# Altium schematic symbol library SCHLIB.SchLib: 2608 symbols (part 9 of 20) (continued)
## L-2.2uH-7A (continued)
FIXED IND 2.2UH 8.7A 15MOHM SMD; Manufacturer Part Number: XGL4030-222MEC; Manufacturer: COILCRAFT; Tolerance: ±20%; Isat: 7A; Shielding: Shielded; Frequency - Self Resonant: 40MHz; Inductance Frequency - Test: 1MHz; Object Type: Part; Design Item ID: L-2.2uH-7A; Series: XGL4030; Material - Core: -; DCR: 15mOhm; Q @ Freq: -; Ratings: AEC-Q200; Operating Temperature: -40°C~125°C; Features: -; Mounting Type: SurfaceMount; Size: 4.00mmx4.00mm; Height: 3.10mm; Category: Inductor
footprint XGL4030
pins: 1, 2

## L-3.3uH-1.05A
designator L?  Inductance: 3.3uH  Current Rating (Amps): 1.1A
FIXED IND 3.3UH 1.1A 228MOHM SMD; Manufacturer Part Number: XPL2010-332MLC; Manufacturer: COILCRAFT; Tolerance: ±20%; Isat: 1.05A; Shielding: Shielded; Frequency - Self Resonant: 55MHz; Inductance Frequency - Test: 1MHz; Object Type: Part; Design Item ID: L-3.3uH-1.05A; Series: XPL2010; Material - Core: -; DCR: 228mOhm; Q @ Freq: -; Ratings: AEC-Q200; Operating Temperature: -40°C~125°C; Features: -; Mounting Type: SurfaceMount; Size: 2.00mmx1.90mm; Height: 1.00mm; Category: Inductor
footprint XPL2010
pins: 1, 2

## L-3.3uH-1.5A
designator L?  Inductance: 3.3uH  Current Rating (Amps): 1.4A
FIXED IND 3.3UH 1.4A 130MOHM SMD; Manufacturer Part Number: LPS3015-332MRC; Manufacturer: COILCRAFT; Material - Core: Ferrite; Tolerance: ±20%; Isat: 1.5A; Shielding: Shielded; Frequency - Self Resonant: 90MHz; Inductance Frequency - Test: 100kHz; Object Type: Part; Design Item ID: L-3.3uH-1.5A; Series: LPS3015; DCR: 130mOhm; Q @ Freq: -; Ratings: AEC-Q200; Operating Temperature: -40°C~125°C; Features: -; Mounting Type: SurfaceMount; Size: 2.95mmx2.95mm; Height: 1.50mm; Category: Inductor
footprint LPS3015
pins: 1, 2

## L-3.3uH-2A
designator L?  Inductance: 3.3uH  Current Rating (Amps): 1.9A
FIXED IND 3.3UH 1.9A 80MOHM SMD; Manufacturer Part Number: LPS4018-332MRC; Manufacturer: COILCRAFT; Material - Core: Ferrite; Tolerance: ±20%; Isat: 2A; Shielding: Shielded; Frequency - Self Resonant: 75MHz; Inductance Frequency - Test: 100kHz; Object Type: Part; Design Item ID: L-3.3uH-2A; Series: LPS4018; DCR: 80mOhm; Q @ Freq: -; Ratings: AEC-Q200; Operating Temperature: -40°C~125°C; Features: -; Mounting Type: SurfaceMount; Size: 3.90mmx3.90mm; Height: 1.80mm; Category: Inductor
footprint LPS4018
pins: 1, 2

## L-3.3uH-4.8A
designator L?  Inductance: 3.3uH  Current Rating (Amps): 6.6A
FIXED IND 3.3UH 6.6A 34MOHM SMD; Manufacturer Part Number: XGL4020-332MEC; Manufacturer: COILCRAFT; Tolerance: ±20%; Isat: 4.8A; Shielding: Shielded; Frequency - Self Resonant: 30MHz; Inductance Frequency - Test: 1MHz; Object Type: Part; Design Item ID: L-3.3uH-4.8A; Series: XGL4020; Material - Core: -; DCR: 34mOhm; Q @ Freq: -; Ratings: AEC-Q200; Operating Temperature: -40°C~125°C; Features: -; Mounting Type: SurfaceMount; Size: 4.00mmx4.00mm; Height: 2.10mm; Category: Inductor
footprint XGL4020
pins: 1, 2

## L-3.3uH-5.3A
designator L?  Inductance: 3.3uH  Current Rating (Amps): 7.5A
FIXED IND 3.3UH 7.5A 21.9MOHM SM; Manufacturer Part Number: XGL4030-332MEC; Manufacturer: COILCRAFT; Tolerance: ±20%; Isat: 5.3A; Shielding: Shielded; Frequency - Self Resonant: 30MHz; Inductance Frequency - Test: 1MHz; Object Type: Part; Design Item ID: L-3.3uH-5.3A; Series: XGL4030; Material - Core: -; DCR: 21.9mOhm; Q @ Freq: -; Ratings: AEC-Q200; Operating Temperature: -40°C~125°C; Features: -; Mounting Type: SurfaceMount; Size: 4.00mmx4.00mm; Height: 3.10mm; Category: Inductor
footprint XGL4030
pins: 1, 2

## L-4.7uH-1.2A
designator L?  Inductance: 4.7uH  Current Rating (Amps): 1.2A
FIXED IND 4.7UH 1.2A 200MOHM SMD; Manufacturer Part Number: LPS3015-472MRC; Manufacturer: COILCRAFT; Material - Core: Ferrite; Tolerance: ±20%; Shielding: Shielded; Frequency - Self Resonant: 79MHz; Inductance Frequency - Test: 100kHz; Object Type: Part; Design Item ID: L-4.7uH-1.2A; Series: LPS3015; Isat: 1.2A; DCR: 200mOhm; Q @ Freq: -; Ratings: AEC-Q200; Operating Temperature: -40°C~125°C; Features: -; Mounting Type: SurfaceMount; Size: 2.95mmx2.95mm; Height: 1.50mm; Category: Inductor
footprint LPS3015
pins: 1, 2

## L-4.7uH-1.9A
designator L?  Inductance: 4.7uH  Current Rating (Amps): 1.8A
FIXED IND 4.7UH 1.8A 125MOHM SMD; Manufacturer Part Number: LPS4018-472MRC; Manufacturer: COILCRAFT; Material - Core: Ferrite; Tolerance: ±20%; Isat: 1.9A; Shielding: Shielded; Frequency - Self Resonant: 65MHz; Inductance Frequency - Test: 100kHz; Object Type: Part; Design Item ID: L-4.7uH-1.9A; Series: LPS4018; DCR: 125mOhm; Q @ Freq: -; Ratings: AEC-Q200; Operating Temperature: -40°C~125°C; Features: -; Mounting Type: SurfaceMount; Size: 3.90mmx3.90mm; Height: 1.80mm; Category: Inductor
footprint LPS4018
pins: 1, 2

## L-4.7uH-4.1A
designator L?  Inductance: 4.7uH  Current Rating (Amps): 5.6A
FIXED IND 4.7UH 5.6A 47.3MOHM SM; Manufacturer Part Number: XGL4020-472MEC; Manufacturer: COILCRAFT; Tolerance: ±20%; Isat: 4.1A; Shielding: Shielded; Frequency - Self Resonant: 23MHz; Inductance Frequency - Test: 1MHz; Object Type: Part; Design Item ID: L-4.7uH-4.1A; Series: XGL4020; Material - Core: -; DCR: 47.3mOhm; Q @ Freq: -; Ratings: AEC-Q200; Operating Temperature: -40°C~125°C; Features: -; Mounting Type: SurfaceMount; Size: 4.00mmx4.00mm; Height: 2.10mm; Category: Inductor
footprint XGL4020
pins: 1, 2

## L-4.7uH-4.4A
designator L?  Inductance: 4.7uH  Current Rating (Amps): 6.6A
FIXED IND 4.7UH 6.6A 31.5MOHM SM; Manufacturer Part Number: XGL4030-472MEC; Manufacturer: COILCRAFT; Tolerance: ±20%; Isat: 4.4A; Shielding: Shielded; Frequency - Self Resonant: 26MHz; Inductance Frequency - Test: 1MHz; Object Type: Part; Design Item ID: L-4.7uH-4.4A; Series: XGL4030; Material - Core: -; DCR: 31.5mOhm; Q @ Freq: -; Ratings: AEC-Q200; Operating Temperature: -40°C~125°C; Features: -; Mounting Type: SurfaceMount; Size: 4.00mmx4.00mm; Height: 3.10mm; Category: Inductor
footprint XGL4030
pins: 1, 2

## L-4.7uH-845mA
designator L?  Inductance: 4.7uH  Current Rating (Amps): 1A
FIXED IND 4.7UH 1A 370 MOHM SMD; Manufacturer Part Number: XPL2010-472MLC; Manufacturer: COILCRAFT; Tolerance: ±20%; Isat: 845mA; Shielding: Shielded; Frequency - Self Resonant: 40MHz; Inductance Frequency - Test: 1MHz; Object Type: Part; Design Item ID: L-4.7uH-845mA; Series: XPL2010; Material - Core: -; DCR: 370mOhm; Q @ Freq: -; Ratings: AEC-Q200; Operating Temperature: -40°C~125°C; Features: -; Mounting Type: SurfaceMount; Size: 2.00mmx1.90mm; Height: 1.00mm; Category: Inductor
footprint XPL2010
pins: 1, 2

## L-5.6uH-3.7A
designator L?  Inductance: 5.6uH  Current Rating (Amps): 5.3A
FIXED IND 5.6UH 5.3A 53.6MOHM SM; Manufacturer Part Number: XGL4020-562MEC; Manufacturer: COILCRAFT; Tolerance: ±20%; Isat: 3.7A; Shielding: Shielded; Frequency - Self Resonant: 22MHz; Inductance Frequency - Test: 1MHz; Object Type: Part; Design Item ID: L-5.6uH-3.7A; Series: XGL4020; Material - Core: -; DCR: 53.6mOhm; Q @ Freq: -; Ratings: AEC-Q200; Operating Temperature: -40°C~125°C; Features: -; Mounting Type: SurfaceMount; Size: 4.00mmx4.00mm; Height: 2.10mm; Category: Inductor
footprint XGL4020
pins: 1, 2

## L-5.6uH-4.2A
designator L?  Inductance: 5.6uH  Current Rating (Amps): 5.5A
FIXED IND 5.6UH 5.5A 34.7MOHM SM; Manufacturer Part Number: XGL4030-562MEC; Manufacturer: COILCRAFT; Tolerance: ±20%; Isat: 4.2A; Shielding: Shielded; Frequency - Self Resonant: 25MHz; Inductance Frequency - Test: 1MHz; Object Type: Part; Design Item ID: L-5.6uH-4.2A; Series: XGL4030; Material - Core: -; DCR: 34.7mOhm; Q @ Freq: -; Ratings: AEC-Q200; Operating Temperature: -40°C~125°C; Features: -; Mounting Type: SurfaceMount; Size: 4.00mmx4.00mm; Height: 3.10mm; Category: Inductor
footprint XGL4030
pins: 1, 2

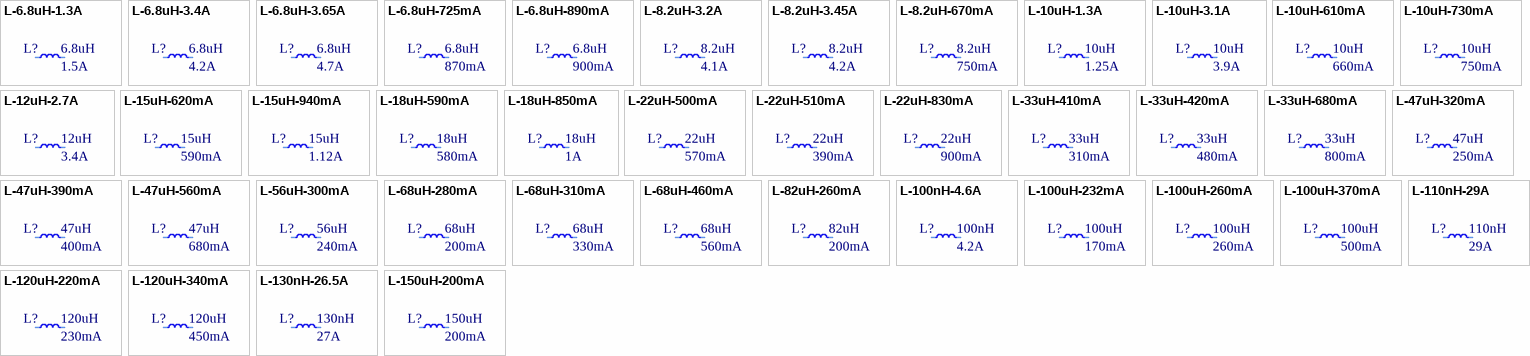
[diagram p39: symbols L-6.8uH-1.3A to L-150uH-200mA]

## L-6.8uH-1.3A
designator L?  Inductance: 6.8uH  Current Rating (Amps): 1.5A
FIXED IND 6.8UH 1.5A 150MOHM SMD; Manufacturer Part Number: LPS4018-682MRC; Manufacturer: COILCRAFT; Material - Core: Ferrite; Tolerance: ±20%; Isat: 1.3A; Shielding: Shielded; Frequency - Self Resonant: 50MHz; Inductance Frequency - Test: 100kHz; Object Type: Part; Design Item ID: L-6.8uH-1.3A; Series: LPS4018; DCR: 150mOhm; Q @ Freq: -; Ratings: AEC-Q200; Operating Temperature: -40°C~125°C; Features: -; Mounting Type: SurfaceMount; Size: 3.90mmx3.90mm; Height: 1.80mm; Category: Inductor
footprint LPS4018
pins: 1, 2

## L-6.8uH-3.4A
designator L?  Inductance: 6.8uH  Current Rating (Amps): 4.2A
FIXED IND 6.8UH 4.2A 70MOHM SMD; Manufacturer Part Number: XGL4020-682MEC; Manufacturer: COILCRAFT; Tolerance: ±20%; Isat: 3.4A; Shielding: Shielded; Frequency - Self Resonant: 21MHz; Inductance Frequency - Test: 1MHz; Object Type: Part; Design Item ID: L-6.8uH-3.4A; Series: XGL4020; Material - Core: -; DCR: 70mOhm; Q @ Freq: -; Ratings: AEC-Q200; Operating Temperature: -40°C~125°C; Features: -; Mounting Type: SurfaceMount; Size: 4.00mmx4.00mm; Height: 2.10mm; Category: Inductor
footprint XGL4020
pins: 1, 2

## L-6.8uH-3.65A
designator L?  Inductance: 6.8uH  Current Rating (Amps): 4.7A
FIXED IND 6.8UH 4.7A 47.9MOHM SM; Manufacturer Part Number: XGL4030-682MEC; Manufacturer: COILCRAFT; Tolerance: ±20%; Isat: 3.65A; Shielding: Shielded; Frequency - Self Resonant: 22MHz; Inductance Frequency - Test: 1MHz; Object Type: Part; Design Item ID: L-6.8uH-3.65A; Series: XGL4030; Material - Core: -; DCR: 47.9mOhm; Q @ Freq: -; Ratings: AEC-Q200; Operating Temperature: -40°C~125°C; Features: -; Mounting Type: SurfaceMount; Size: 4.00mmx4.00mm; Height: 3.10mm; Category: Inductor
footprint XGL4030
pins: 1, 2

## L-6.8uH-725mA
designator L?  Inductance: 6.8uH  Current Rating (Amps): 870mA
FIXED IND 6.8UH 870MA 463MOHM SM; Manufacturer Part Number: XPL2010-682MLC; Manufacturer: COILCRAFT; Tolerance: ±20%; Isat: 725mA; Shielding: Shielded; Frequency - Self Resonant: 33MHz; Inductance Frequency - Test: 1MHz; Object Type: Part; Design Item ID: L-6.8uH-725mA; Series: XPL2010; Material - Core: -; DCR: 463mOhm; Q @ Freq: -; Ratings: AEC-Q200; Operating Temperature: -40°C~125°C; Features: -; Mounting Type: SurfaceMount; Size: 2.00mmx1.90mm; Height: 1.00mm; Category: Inductor
footprint XPL2010
pins: 1, 2

## L-6.8uH-890mA
designator L?  Inductance: 6.8uH  Current Rating (Amps): 900mA
FIXED IND 6.8UH 900MA 300MOHM SM; Manufacturer Part Number: LPS3015-682MRC; Manufacturer: COILCRAFT; Material - Core: Ferrite; Tolerance: ±20%; Isat: 890mA; Shielding: Shielded; Frequency - Self Resonant: 58MHz; Inductance Frequency - Test: 100kHz; Object Type: Part; Design Item ID: L-6.8uH-890mA; Series: LPS3015; DCR: 300mOhm; Q @ Freq: -; Ratings: AEC-Q200; Operating Temperature: -40°C~125°C; Features: -; Mounting Type: SurfaceMount; Size: 2.95mmx2.95mm; Height: 1.50mm; Category: Inductor
footprint LPS3015
pins: 1, 2

## L-8.2uH-3.2A
designator L?  Inductance: 8.2uH  Current Rating (Amps): 4.1A
FIXED IND 8.2UH 4.1A 78.1MOHM SM; Manufacturer Part Number: XGL4020-822MEC; Manufacturer: COILCRAFT; Tolerance: ±20%; Isat: 3.2A; Shielding: Shielded; Frequency - Self Resonant: 20MHz; Inductance Frequency - Test: 1MHz; Object Type: Part; Design Item ID: L-8.2uH-3.2A; Series: XGL4020; Material - Core: -; DCR: 78.1mOhm; Q @ Freq: -; Ratings: AEC-Q200; Operating Temperature: -40°C~125°C; Features: -; Mounting Type: SurfaceMount; Size: 4.00mmx4.00mm; Height: 2.10mm; Category: Inductor
footprint XGL4020
pins: 1, 2

## L-8.2uH-3.45A
designator L?  Inductance: 8.2uH  Current Rating (Amps): 4.2A
FIXED IND 8.2UH 4.2A 55.7MOHM SM; Manufacturer Part Number: XGL4030-822MEC; Manufacturer: COILCRAFT; Tolerance: ±20%; Isat: 3.45A; Shielding: Shielded; Frequency - Self Resonant: 20MHz; Inductance Frequency - Test: 1MHz; Object Type: Part; Design Item ID: L-8.2uH-3.45A; Series: XGL4030; Material - Core: -; DCR: 55.7mOhm; Q @ Freq: -; Ratings: AEC-Q200; Operating Temperature: -40°C~125°C; Features: -; Mounting Type: SurfaceMount; Size: 4.00mmx4.00mm; Height: 3.10mm; Category: Inductor
footprint XGL4030
pins: 1, 2

## L-8.2uH-670mA
designator L?  Inductance: 8.2uH  Current Rating (Amps): 750mA
FIXED IND 8.2UH 750MA 503MOHM SM; Manufacturer Part Number: XPL2010-822MLC; Manufacturer: COILCRAFT; Tolerance: ±20%; Isat: 670mA; Shielding: Shielded; Frequency - Self Resonant: 30MHz; Inductance Frequency - Test: 1MHz; Object Type: Part; Design Item ID: L-8.2uH-670mA; Series: XPL2010; Material - Core: -; DCR: 503mOhm; Q @ Freq: -; Ratings: AEC-Q200; Operating Temperature: -40°C~125°C; Features: -; Mounting Type: SurfaceMount; Size: 2.00mmx1.90mm; Height: 1.00mm; Category: Inductor
footprint XPL2010
pins: 1, 2

## L-10uH-1.3A
designator L?  Inductance: 10uH  Current Rating (Amps): 1.25A
FIXED IND 10UH 1.25A 200MOHM SMD; Manufacturer Part Number: LPS4018-103MRC; Manufacturer: COILCRAFT; Material - Core: Ferrite; Tolerance: ±20%; Isat: 1.3A; Shielding: Shielded; Frequency - Self Resonant: 40MHz; Inductance Frequency - Test: 100kHz; Object Type: Part; Design Item ID: L-10uH-1.3A; Series: LPS4018; DCR: 200mOhm; Q @ Freq: -; Ratings: AEC-Q200; Operating Temperature: -40°C~125°C; Features: -; Mounting Type: SurfaceMount; Size: 3.90mmx3.90mm; Height: 1.80mm; Category: Inductor
footprint LPS4018
pins: 1, 2

## L-10uH-3.1A
designator L?  Inductance: 10uH  Current Rating (Amps): 3.9A
FIXED IND 10UH 3.9A 69.5MOHM SMD; Manufacturer Part Number: XGL4030-103MEC; Manufacturer: COILCRAFT; Tolerance: ±20%; Isat: 3.1A; Shielding: Shielded; Frequency - Self Resonant: 18.5MHz; Inductance Frequency - Test: 1MHz; Object Type: Part; Design Item ID: L-10uH-3.1A; Series: XGL4030; Material - Core: -; DCR: 69.5mOhm; Q @ Freq: -; Ratings: AEC-Q200; Operating Temperature: -40°C~125°C; Features: -; Mounting Type: SurfaceMount; Size: 4.00mmx4.00mm; Height: 3.10mm; Category: Inductor
footprint XGL4030
pins: 1, 2

## L-10uH-610mA
designator L?  Inductance: 10uH  Current Rating (Amps): 660mA
FIXED IND 10UH 660MA 611MOHM SMD; Manufacturer Part Number: XPL2010-103MLC; Manufacturer: COILCRAFT; Tolerance: ±20%; Isat: 610mA; Shielding: Shielded; Frequency - Self Resonant: 28MHz; Inductance Frequency - Test: 1MHz; Object Type: Part; Design Item ID: L-10uH-610mA; Series: XPL2010; Material - Core: -; DCR: 611mOhm; Q @ Freq: -; Ratings: AEC-Q200; Operating Temperature: -40°C~125°C; Features: -; Mounting Type: SurfaceMount; Size: 2.00mmx1.90mm; Height: 1.00mm; Category: Inductor
footprint XPL2010
pins: 1, 2

## L-10uH-730mA
designator L?  Inductance: 10uH  Current Rating (Amps): 750mA
FIXED IND 10UH 750MA 440MOHM SMD; Manufacturer Part Number: LPS3015-103MRC; Manufacturer: COILCRAFT; Material - Core: Ferrite; Tolerance: ±20%; Isat: 730mA; Shielding: Shielded; Frequency - Self Resonant: 48MHz; Inductance Frequency - Test: 100kHz; Object Type: Part; Design Item ID: L-10uH-730mA; Series: LPS3015; DCR: 440mOhm; Q @ Freq: -; Ratings: AEC-Q200; Operating Temperature: -40°C~125°C; Features: -; Mounting Type: SurfaceMount; Size: 2.95mmx2.95mm; Height: 1.50mm; Category: Inductor
footprint LPS3015
pins: 1, 2

## L-12uH-2.7A
designator L?  Inductance: 12uH  Current Rating (Amps): 3.4A
FIXED IND 12UH 3.4A 86.5MOHM SMD; Manufacturer Part Number: XGL4030-123MEC; Manufacturer: COILCRAFT; Tolerance: ±20%; Isat: 2.7A; Shielding: Shielded; Frequency - Self Resonant: 17MHz; Inductance Frequency - Test: 1MHz; Object Type: Part; Design Item ID: L-12uH-2.7A; Series: XGL4030; Material - Core: -; DCR: 86.5mOhm; Q @ Freq: -; Ratings: AEC-Q200; Operating Temperature: -40°C~125°C; Features: -; Mounting Type: SurfaceMount; Size: 4.00mmx4.00mm; Height: 3.10mm; Category: Inductor
footprint XGL4030
pins: 1, 2

## L-15uH-620mA
designator L?  Inductance: 15uH  Current Rating (Amps): 590mA
FIXED IND 15UH 590MA 700MOHM SMD; Manufacturer Part Number: LPS3015-153MRC; Manufacturer: COILCRAFT; Material - Core: Ferrite; Tolerance: ±20%; Isat: 620mA; Shielding: Shielded; Frequency - Self Resonant: 35MHz; Inductance Frequency - Test: 100kHz; Object Type: Part; Design Item ID: L-15uH-620mA; Series: LPS3015; DCR: 700mOhm; Q @ Freq: -; Ratings: AEC-Q200; Operating Temperature: -40°C~125°C; Features: -; Mounting Type: SurfaceMount; Size: 2.95mmx2.95mm; Height: 1.50mm; Category: Inductor
footprint LPS3015
pins: 1, 2

## L-15uH-940mA
designator L?  Inductance: 15uH  Current Rating (Amps): 1.12A
FIXED IND 15UH 1.12A 260MOHM SMD; Manufacturer Part Number: LPS4018-153MRC; Manufacturer: COILCRAFT; Material - Core: Ferrite; Tolerance: ±20%; Isat: 940mA; Shielding: Shielded; Frequency - Self Resonant: 32MHz; Inductance Frequency - Test: 100kHz; Object Type: Part; Design Item ID: L-15uH-940mA; Series: LPS4018; DCR: 260mOhm; Q @ Freq: -; Ratings: AEC-Q200; Operating Temperature: -40°C~125°C; Features: -; Mounting Type: SurfaceMount; Size: 3.90mmx3.90mm; Height: 1.80mm; Category: Inductor
footprint LPS4018
pins: 1, 2

## L-18uH-590mA
designator L?  Inductance: 18uH  Current Rating (Amps): 580mA
FIXED IND 18UH 580MA 750MOHM SMD; Manufacturer Part Number: LPS3015-183MRC; Manufacturer: COILCRAFT; Material - Core: Ferrite; Tolerance: ±20%; Isat: 590mA; Shielding: Shielded; Frequency - Self Resonant: 33MHz; Inductance Frequency - Test: 100kHz; Object Type: Part; Design Item ID: L-18uH-590mA; Series: LPS3015; DCR: 750mOhm; Q @ Freq: -; Ratings: AEC-Q200; Operating Temperature: -40°C~125°C; Features: -; Mounting Type: SurfaceMount; Size: 2.95mmx2.95mm; Height: 1.50mm; Category: Inductor
footprint LPS3015
pins: 1, 2

## L-18uH-850mA
designator L?  Inductance: 18uH  Current Rating (Amps): 1A
FIXED IND 18UH 1A 270 MOHM SMD; Manufacturer Part Number: LPS4018-183MRC; Manufacturer: COILCRAFT; Material - Core: Ferrite; Tolerance: ±20%; Isat: 850mA; Shielding: Shielded; Frequency - Self Resonant: 27MHz; Inductance Frequency - Test: 100kHz; Object Type: Part; Design Item ID: L-18uH-850mA; Series: LPS4018; DCR: 270mOhm; Q @ Freq: -; Ratings: AEC-Q200; Operating Temperature: -40°C~125°C; Features: -; Mounting Type: SurfaceMount; Size: 3.90mmx3.90mm; Height: 1.80mm; Category: Inductor
footprint LPS4018
pins: 1, 2

## L-22uH-500mA
designator L?  Inductance: 22uH  Current Rating (Amps): 570mA
FIXED IND 22UH 570MA 825MOHM SMD; Manufacturer Part Number: LPS3015-223MRC; Manufacturer: COILCRAFT; Material - Core: Ferrite; Tolerance: ±20%; Isat: 500mA; Shielding: Shielded; Frequency - Self Resonant: 30MHz; Inductance Frequency - Test: 100kHz; Object Type: Part; Design Item ID: L-22uH-500mA; Series: LPS3015; DCR: 825mOhm; Q @ Freq: -; Ratings: AEC-Q200; Operating Temperature: -40°C~125°C; Features: -; Mounting Type: SurfaceMount; Size: 2.95mmx2.95mm; Height: 1.50mm; Category: Inductor
footprint LPS3015
pins: 1, 2

## L-22uH-510mA
designator L?  Inductance: 22uH  Current Rating (Amps): 390mA
FIXED IND 22UH 390MA 2 OHM SMD; Manufacturer Part Number: XPL2010-223MLC; Manufacturer: COILCRAFT; Tolerance: ±20%; Isat: 510mA; Shielding: Shielded; DCR: 2Ohm; Frequency - Self Resonant: 25MHz; Inductance Frequency - Test: 1MHz; Object Type: Part; Design Item ID: L-22uH-510mA; Series: XPL2010; Material - Core: -; Q @ Freq: -; Ratings: AEC-Q200; Operating Temperature: -40°C~125°C; Features: -; Mounting Type: SurfaceMount; Size: 2.00mmx1.90mm; Height: 1.00mm; Category: Inductor
footprint XPL2010
pins: 1, 2

## L-22uH-830mA
designator L?  Inductance: 22uH  Current Rating (Amps): 900mA
FIXED IND 22UH 900MA 360MOHM SMD; Manufacturer Part Number: LPS4018-223MRC; Manufacturer: COILCRAFT; Material - Core: Ferrite; Tolerance: ±20%; Isat: 830mA; Shielding: Shielded; Frequency - Self Resonant: 26MHz; Inductance Frequency - Test: 100kHz; Object Type: Part; Design Item ID: L-22uH-830mA; Series: LPS4018; DCR: 360mOhm; Q @ Freq: -; Ratings: AEC-Q200; Operating Temperature: -40°C~125°C; Features: -; Mounting Type: SurfaceMount; Size: 3.90mmx3.90mm; Height: 1.80mm; Category: Inductor
footprint LPS4018
pins: 1, 2

## L-33uH-410mA
designator L?  Inductance: 33uH  Current Rating (Amps): 310mA
FIXED IND 33UH 310MA 2.85OHM SMD; Manufacturer Part Number: XPL2010-333MLC; Manufacturer: COILCRAFT; Tolerance: ±20%; Isat: 410mA; Shielding: Shielded; Frequency - Self Resonant: 20MHz; Inductance Frequency - Test: 1MHz; Object Type: Part; Design Item ID: L-33uH-410mA; Series: XPL2010; Material - Core: -; DCR: 2.85Ohm; Q @ Freq: -; Ratings: AEC-Q200; Operating Temperature: -40°C~125°C; Features: -; Mounting Type: SurfaceMount; Size: 2.00mmx1.90mm; Height: 1.00mm; Category: Inductor
footprint XPL2010
pins: 1, 2

## L-33uH-420mA
designator L?  Inductance: 33uH  Current Rating (Amps): 480mA
FIXED IND 33UH 480MA 1.3 OHM SMD; Manufacturer Part Number: LPS3015-333MRC; Manufacturer: COILCRAFT; Material - Core: Ferrite; Tolerance: ±20%; Isat: 420mA; Shielding: Shielded; DCR: 1.3Ohm; Frequency - Self Resonant: 23MHz; Inductance Frequency - Test: 100kHz; Object Type: Part; Design Item ID: L-33uH-420mA; Series: LPS3015; Q @ Freq: -; Ratings: AEC-Q200; Operating Temperature: -40°C~125°C; Features: -; Mounting Type: SurfaceMount; Size: 2.95mmx2.95mm; Height: 1.50mm; Category: Inductor
footprint LPS3015
pins: 1, 2

## L-33uH-680mA
designator L?  Inductance: 33uH  Current Rating (Amps): 800mA
FIXED IND 33UH 800MA 420MOHM SMD; Manufacturer Part Number: LPS4018-333MRC; Manufacturer: COILCRAFT; Material - Core: Ferrite; Tolerance: ±20%; Isat: 680mA; Shielding: Shielded; Frequency - Self Resonant: 20MHz; Inductance Frequency - Test: 100kHz; Object Type: Part; Design Item ID: L-33uH-680mA; Series: LPS4018; DCR: 420mOhm; Q @ Freq: -; Ratings: AEC-Q200; Operating Temperature: -40°C~125°C; Features: -; Mounting Type: SurfaceMount; Size: 3.90mmx3.90mm; Height: 1.80mm; Category: Inductor
footprint LPS4018
pins: 1, 2

## L-47uH-320mA
designator L?  Inductance: 47uH  Current Rating (Amps): 250mA
FIXED IND 47UH 250MA 4.25OHM SMD; Manufacturer Part Number: XPL2010-473MLC; Manufacturer: COILCRAFT; Tolerance: ±20%; Isat: 320mA; Shielding: Shielded; Frequency - Self Resonant: 17MHz; Inductance Frequency - Test: 1MHz; Object Type: Part; Design Item ID: L-47uH-320mA; Series: XPL2010; Material - Core: -; DCR: 4.25Ohm; Q @ Freq: -; Ratings: AEC-Q200; Operating Temperature: -40°C~125°C; Features: -; Mounting Type: SurfaceMount; Size: 2.00mmx1.90mm; Height: 1.00mm; Category: Inductor
footprint XPL2010
pins: 1, 2

## L-47uH-390mA
designator L?  Inductance: 47uH  Current Rating (Amps): 400mA
FIXED IND 47UH 400MA 1.55OHM SMD; Manufacturer Part Number: LPS3015-473MRC; Manufacturer: COILCRAFT; Material - Core: Ferrite; Tolerance: ±20%; Isat: 390mA; Shielding: Shielded; Frequency - Self Resonant: 17MHz; Inductance Frequency - Test: 100kHz; Object Type: Part; Design Item ID: L-47uH-390mA; Series: LPS3015; DCR: 1.55Ohm; Q @ Freq: -; Ratings: AEC-Q200; Operating Temperature: -40°C~125°C; Features: -; Mounting Type: SurfaceMount; Size: 2.95mmx2.95mm; Height: 1.50mm; Category: Inductor
footprint LPS3015
pins: 1, 2

## L-47uH-560mA
designator L?  Inductance: 47uH  Current Rating (Amps): 680mA
FIXED IND 47UH 680MA 650MOHM SMD; Manufacturer Part Number: LPS4018-473MRC; Manufacturer: COILCRAFT; Material - Core: Ferrite; Tolerance: ±20%; Isat: 560mA; Shielding: Shielded; Frequency - Self Resonant: 16MHz; Inductance Frequency - Test: 100kHz; Object Type: Part; Design Item ID: L-47uH-560mA; Series: LPS4018; DCR: 650mOhm; Q @ Freq: -; Ratings: AEC-Q200; Operating Temperature: -40°C~125°C; Features: -; Mounting Type: SurfaceMount; Size: 3.90mmx3.90mm; Height: 1.80mm; Category: Inductor
footprint LPS4018
pins: 1, 2

## L-56uH-300mA
designator L?  Inductance: 56uH  Current Rating (Amps): 240mA
FIXED IND 56UH 240MA 4.82OHM SMD; Manufacturer Part Number: XPL2010-563MLC; Manufacturer: COILCRAFT; Tolerance: ±20%; Isat: 300mA; Shielding: Shielded; Frequency - Self Resonant: 15MHz; Inductance Frequency - Test: 1MHz; Object Type: Part; Design Item ID: L-56uH-300mA; Series: XPL2010; Material - Core: -; DCR: 4.82Ohm; Q @ Freq: -; Ratings: AEC-Q200; Operating Temperature: -40°C~125°C; Features: -; Mounting Type: SurfaceMount; Size: 2.00mmx1.90mm; Height: 1.00mm; Category: Inductor
footprint XPL2010
pins: 1, 2

## L-68uH-280mA
designator L?  Inductance: 68uH  Current Rating (Amps): 200mA
FIXED IND 68UH 200MA 6.56OHM SMD; Manufacturer Part Number: XPL2010-683MLC; Manufacturer: COILCRAFT; Tolerance: ±20%; Isat: 280mA; Shielding: Shielded; Frequency - Self Resonant: 13MHz; Inductance Frequency - Test: 1MHz; Object Type: Part; Design Item ID: L-68uH-280mA; Series: XPL2010; Material - Core: -; DCR: 6.56Ohm; Q @ Freq: -; Ratings: AEC-Q200; Operating Temperature: -40°C~125°C; Features: -; Mounting Type: SurfaceMount; Size: 2.00mmx1.90mm; Height: 1.00mm; Category: Inductor
footprint XPL2010
pins: 1, 2

## L-68uH-310mA
designator L?  Inductance: 68uH  Current Rating (Amps): 330mA
FIXED IND 68UH 330MA 2.35OHM SMD; Manufacturer Part Number: LPS3015-683MRC; Manufacturer: COILCRAFT; Material - Core: Ferrite; Tolerance: ±20%; Isat: 310mA; Shielding: Shielded; Frequency - Self Resonant: 14MHz; Inductance Frequency - Test: 100kHz; Object Type: Part; Design Item ID: L-68uH-310mA; Series: LPS3015; DCR: 2.35Ohm; Q @ Freq: -; Ratings: AEC-Q200; Operating Temperature: -40°C~125°C; Features: -; Mounting Type: SurfaceMount; Size: 2.95mmx2.95mm; Height: 1.50mm; Category: Inductor
footprint LPS3015
pins: 1, 2

## L-68uH-460mA
designator L?  Inductance: 68uH  Current Rating (Amps): 560mA
FIXED IND 68UH 560MA 950MOHM SMD; Manufacturer Part Number: LPS4018-683MRC; Manufacturer: COILCRAFT; Material - Core: Ferrite; Tolerance: ±20%; Isat: 460mA; Shielding: Shielded; Frequency - Self Resonant: 13MHz; Inductance Frequency - Test: 100kHz; Object Type: Part; Design Item ID: L-68uH-460mA; Series: LPS4018; DCR: 950mOhm; Q @ Freq: -; Ratings: AEC-Q200; Operating Temperature: -40°C~125°C; Features: -; Mounting Type: SurfaceMount; Size: 3.90mmx3.90mm; Height: 1.80mm; Category: Inductor
footprint LPS4018
pins: 1, 2

## L-82uH-260mA
designator L?  Inductance: 82uH  Current Rating (Amps): 200mA
FIXED IND 82UH 200MA 6.9 OHM SMD; Manufacturer Part Number: XPL2010-823MLC; Manufacturer: COILCRAFT; Tolerance: ±20%; Isat: 260mA; Shielding: Shielded; DCR: 6.9Ohm; Frequency - Self Resonant: 12MHz; Inductance Frequency - Test: 1MHz; Object Type: Part; Design Item ID: L-82uH-260mA; Series: XPL2010; Material - Core: -; Q @ Freq: -; Ratings: AEC-Q200; Operating Temperature: -40°C~125°C; Features: -; Mounting Type: SurfaceMount; Size: 2.00mmx1.90mm; Height: 1.00mm; Category: Inductor
footprint XPL2010
pins: 1, 2

## L-100nH-4.6A
designator L?  Inductance: 100nH  Current Rating (Amps): 4.2A
FIXED IND 100NH 4.2A 18MOHM SMD; Manufacturer Part Number: XPL2010-101MLC; Manufacturer: COILCRAFT; Tolerance: ±20%; Isat: 4.6A; Shielding: Shielded; Frequency - Self Resonant: 660MHz; Inductance Frequency - Test: 1MHz; Object Type: Part; Design Item ID: L-100nH-4.6A; Series: XPL2010; Material - Core: -; DCR: 18mOhm; Q @ Freq: -; Ratings: AEC-Q200; Operating Temperature: -40°C~125°C; Features: -; Mounting Type: SurfaceMount; Size: 2.00mmx1.90mm; Height: 1.00mm; Category: Inductor
footprint XPL2010
pins: 1, 2

## L-100uH-232mA
designator L?  Inductance: 100uH  Current Rating (Amps): 170mA
FIXED IND 100UH 170MA 9.27OHM SM; Manufacturer Part Number: XPL2010-104MLC; Manufacturer: COILCRAFT; Tolerance: ±20%; Isat: 232mA; Shielding: Shielded; Frequency - Self Resonant: 11MHz; Inductance Frequency - Test: 1MHz; Object Type: Part; Design Item ID: L-100uH-232mA; Series: XPL2010; Material - Core: -; DCR: 9.27Ohm; Q @ Freq: -; Ratings: AEC-Q200; Operating Temperature: -40°C~125°C; Features: -; Mounting Type: SurfaceMount; Size: 2.00mmx1.90mm; Height: 1.00mm; Category: Inductor
footprint XPL2010
pins: 1, 2

## L-100uH-260mA
designator L?  Inductance: 100uH  Current Rating (Amps): 260mA
FIXED IND 100UH 260MA 3.4OHM SMD; Manufacturer Part Number: LPS3015-104MRC; Manufacturer: COILCRAFT; Material - Core: Ferrite; Tolerance: ±20%; Shielding: Shielded; Frequency - Self Resonant: 11MHz; Inductance Frequency - Test: 100kHz; Object Type: Part; Design Item ID: L-100uH-260mA; Series: LPS3015; Isat: 260mA; DCR: 3.4Ohm; Q @ Freq: -; Ratings: AEC-Q200; Operating Temperature: -40°C~125°C; Features: -; Mounting Type: SurfaceMount; Size: 2.95mmx2.95mm; Height: 1.50mm; Category: Inductor
footprint LPS3015
pins: 1, 2

## L-100uH-370mA
designator L?  Inductance: 100uH  Current Rating (Amps): 500mA
FIXED IND 100UH 500MA 1.4OHM SMD; Manufacturer Part Number: LPS4018-104MRC; Manufacturer: COILCRAFT; Material - Core: Ferrite; Tolerance: ±20%; Isat: 370mA; Shielding: Shielded; Frequency - Self Resonant: 10MHz; Inductance Frequency - Test: 100kHz; Object Type: Part; Design Item ID: L-100uH-370mA; Series: LPS4018; DCR: 1.4Ohm; Q @ Freq: -; Ratings: AEC-Q200; Operating Temperature: -40°C~125°C; Features: -; Mounting Type: SurfaceMount; Size: 3.90mmx3.90mm; Height: 1.80mm; Category: Inductor
footprint LPS4018
pins: 1, 2

## L-110nH-29A
designator L?  Inductance: 110nH  Current Rating (Amps): 29A
FIXED IND 110NH 29A 1.7MOHM SMD; Manufacturer Part Number: XGL4020-111MEC; Manufacturer: COILCRAFT; Tolerance: ±20%; Shielding: Shielded; Frequency - Self Resonant: 250MHz; Inductance Frequency - Test: 1MHz; Object Type: Part; Design Item ID: L-110nH-29A; Series: XGL4020; Material - Core: -; Isat: 29A; DCR: 1.7mOhm; Q @ Freq: -; Ratings: AEC-Q200; Operating Temperature: -40°C~125°C; Features: -; Mounting Type: SurfaceMount; Size: 4.00mmx4.00mm; Height: 2.10mm; Category: Inductor
footprint XGL4020
pins: 1, 2

## L-120uH-220mA
designator L?  Inductance: 120uH  Current Rating (Amps): 230mA
FIXED IND 120UH 230MA 4.65OHM SM; Manufacturer Part Number: LPS3015-124MRC; Manufacturer: COILCRAFT; Material - Core: Ferrite; Tolerance: ±20%; Isat: 220mA; Shielding: Shielded; Frequency - Self Resonant: 9MHz; Inductance Frequency - Test: 100kHz; Object Type: Part; Design Item ID: L-120uH-220mA; Series: LPS3015; DCR: 4.65Ohm; Q @ Freq: -; Ratings: AEC-Q200; Operating Temperature: -40°C~125°C; Features: -; Mounting Type: SurfaceMount; Size: 2.95mmx2.95mm; Height: 1.50mm; Category: Inductor
footprint LPS3015
pins: 1, 2

## L-120uH-340mA
designator L?  Inductance: 120uH  Current Rating (Amps): 450mA
FIXED IND 120UH 450MA 1.6OHM SMD; Manufacturer Part Number: LPS4018-124MRC; Manufacturer: COILCRAFT; Material - Core: Ferrite; Tolerance: ±20%; Isat: 340mA; Shielding: Shielded; Frequency - Self Resonant: 9MHz; Inductance Frequency - Test: 100kHz; Object Type: Part; Design Item ID: L-120uH-340mA; Series: LPS4018; DCR: 1.6Ohm; Q @ Freq: -; Ratings: AEC-Q200; Operating Temperature: -40°C~125°C; Features: -; Mounting Type: SurfaceMount; Size: 3.90mmx3.90mm; Height: 1.80mm; Category: Inductor
footprint LPS4018
pins: 1, 2

## L-130nH-26.5A
designator L?  Inductance: 130nH  Current Rating (Amps): 27A
FIXED IND 130NH 27A 1.8MOHM SMD; Manufacturer Part Number: XGL4030-131MEC; Manufacturer: COILCRAFT; Tolerance: ±20%; Isat: 26.5A; Shielding: Shielded; Frequency - Self Resonant: 265MHz; Inductance Frequency - Test: 1MHz; Object Type: Part; Design Item ID: L-130nH-26.5A; Series: XGL4030; Material - Core: -; DCR: 1.8mOhm; Q @ Freq: -; Ratings: AEC-Q200; Operating Temperature: -40°C~125°C; Features: -; Mounting Type: SurfaceMount; Size: 4.00mmx4.00mm; Height: 3.10mm; Category: Inductor
footprint XGL4030
pins: 1, 2

## L-150uH-200mA
designator L?  Inductance: 150uH  Current Rating (Amps): 200mA
FIXED IND 150UH 200MA 6.25OHM SM; Manufacturer Part Number: LPS3015-154MRC; Manufacturer: COILCRAFT; Material - Core: Ferrite; Tolerance: ±20%; Shielding: Shielded; Frequency - Self Resonant: 8MHz; Inductance Frequency - Test: 100kHz; Object Type: Part; Design Item ID: L-150uH-200mA; Series: LPS3015; Isat: 200mA; DCR: 6.25Ohm; Q @ Freq: -; Ratings: AEC-Q200; Operating Temperature: -40°C~125°C; Features: -; Mounting Type: SurfaceMount; Size: 2.95mmx2.95mm; Height: 1.50mm; Category: Inductor
footprint LPS3015
pins: 1, 2

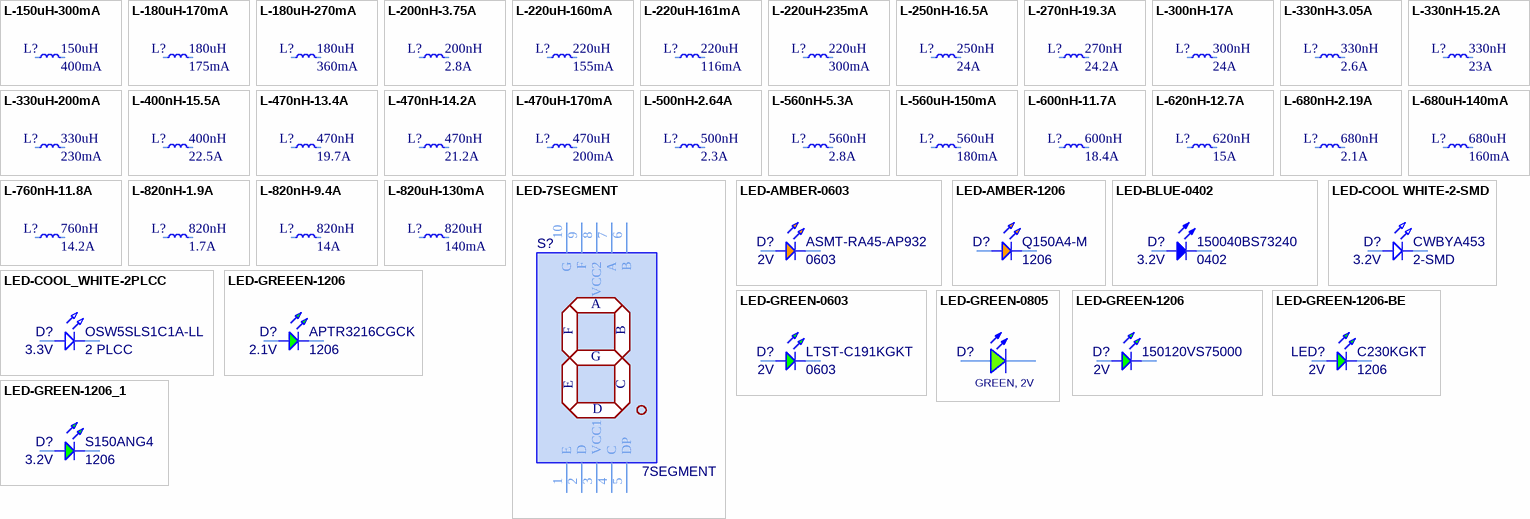
[diagram p40: symbols L-150uH-300mA to LED-GREEN-1206_1]

## L-150uH-300mA
designator L?  Inductance: 150uH  Current Rating (Amps): 400mA
FIXED IND 150UH 400MA 2 OHM SMD; Manufacturer Part Number: LPS4018-154MRC; Manufacturer: COILCRAFT; Material - Core: Ferrite; Tolerance: ±20%; Isat: 300mA; Shielding: Shielded; DCR: 2Ohm; Frequency - Self Resonant: 8MHz; Inductance Frequency - Test: 100kHz; Object Type: Part; Design Item ID: L-150uH-300mA; Series: LPS4018; Q @ Freq: -; Ratings: AEC-Q200; Operating Temperature: -40°C~125°C; Features: -; Mounting Type: SurfaceMount; Size: 3.90mmx3.90mm; Height: 1.80mm; Category: Inductor
footprint LPS4018
pins: 1, 2

## L-180uH-170mA
designator L?  Inductance: 180uH  Current Rating (Amps): 175mA
FIXED IND 180UH 175MA 8.6OHM SMD; Manufacturer Part Number: LPS3015-184MRC; Manufacturer: COILCRAFT; Material - Core: Ferrite; Tolerance: ±20%; Isat: 170mA; Shielding: Shielded; Frequency - Self Resonant: 7.5MHz; Inductance Frequency - Test: 100kHz; Object Type: Part; Design Item ID: L-180uH-170mA; Series: LPS3015; DCR: 8.6Ohm; Q @ Freq: -; Ratings: AEC-Q200; Operating Temperature: -40°C~125°C; Features: -; Mounting Type: SurfaceMount; Size: 2.95mmx2.95mm; Height: 1.50mm; Category: Inductor
footprint LPS3015
pins: 1, 2

## L-180uH-270mA
designator L?  Inductance: 180uH  Current Rating (Amps): 360mA
FIXED IND 180UH 360MA 2.5OHM SMD; Manufacturer Part Number: LPS4018-184MRC; Manufacturer: COILCRAFT; Material - Core: Ferrite; Tolerance: ±20%; Isat: 270mA; Shielding: Shielded; Frequency - Self Resonant: 7.5MHz; Inductance Frequency - Test: 100kHz; Object Type: Part; Design Item ID: L-180uH-270mA; Series: LPS4018; DCR: 2.5Ohm; Q @ Freq: -; Ratings: AEC-Q200; Operating Temperature: -40°C~125°C; Features: -; Mounting Type: SurfaceMount; Size: 3.90mmx3.90mm; Height: 1.80mm; Category: Inductor
footprint LPS4018
pins: 1, 2

## L-200nH-3.75A
designator L?  Inductance: 200nH  Current Rating (Amps): 2.8A
FIXED IND 200NH 2.8A 27MOHM SMD; Manufacturer Part Number: XPL2010-201MLC; Manufacturer: COILCRAFT; Tolerance: ±20%; Isat: 3.75A; Shielding: Shielded; Frequency - Self Resonant: 408MHz; Inductance Frequency - Test: 1MHz; Object Type: Part; Design Item ID: L-200nH-3.75A; Series: XPL2010; Material - Core: -; DCR: 27mOhm; Q @ Freq: -; Ratings: AEC-Q200; Operating Temperature: -40°C~125°C; Features: -; Mounting Type: SurfaceMount; Size: 2.00mmx1.90mm; Height: 1.00mm; Category: Inductor
footprint XPL2010
pins: 1, 2

## L-220uH-160mA
designator L?  Inductance: 220uH  Current Rating (Amps): 155mA
FIXED IND 220UH 155MA 9.5OHM SMD; Manufacturer Part Number: LPS3015-224MRC; Manufacturer: COILCRAFT; Material - Core: Ferrite; Tolerance: ±20%; Isat: 160mA; Shielding: Shielded; Frequency - Self Resonant: 6MHz; Inductance Frequency - Test: 100kHz; Object Type: Part; Design Item ID: L-220uH-160mA; Series: LPS3015; DCR: 9.5Ohm; Q @ Freq: -; Ratings: AEC-Q200; Operating Temperature: -40°C~125°C; Features: -; Mounting Type: SurfaceMount; Size: 2.95mmx2.95mm; Height: 1.50mm; Category: Inductor
footprint LPS3015
pins: 1, 2

## L-220uH-161mA
designator L?  Inductance: 220uH  Current Rating (Amps): 116mA
FIXED IND 220UH 116MA 21.1OHM SM; Manufacturer Part Number: XPL2010-224MLC; Manufacturer: COILCRAFT; Tolerance: ±20%; Isat: 161mA; Shielding: Shielded; Frequency - Self Resonant: 7.1MHz; Inductance Frequency - Test: 1MHz; Object Type: Part; Design Item ID: L-220uH-161mA; Series: XPL2010; Material - Core: -; DCR: 21.1Ohm; Q @ Freq: -; Ratings: AEC-Q200; Operating Temperature: -40°C~125°C; Features: -; Mounting Type: SurfaceMount; Size: 2.00mmx1.90mm; Height: 1.00mm; Category: Inductor
footprint XPL2010
pins: 1, 2

## L-220uH-235mA
designator L?  Inductance: 220uH  Current Rating (Amps): 300mA
FIXED IND 220UH 300MA 3.7OHM SMD; Manufacturer Part Number: LPS4018-224MRC; Manufacturer: COILCRAFT; Material - Core: Ferrite; Tolerance: ±20%; Isat: 235mA; Shielding: Shielded; Frequency - Self Resonant: 6.5MHz; Inductance Frequency - Test: 100kHz; Object Type: Part; Design Item ID: L-220uH-235mA; Series: LPS4018; DCR: 3.7Ohm; Q @ Freq: -; Ratings: AEC-Q200; Operating Temperature: -40°C~125°C; Features: -; Mounting Type: SurfaceMount; Size: 3.90mmx3.90mm; Height: 1.80mm; Category: Inductor
footprint LPS4018
pins: 1, 2

## L-250nH-16.5A
designator L?  Inductance: 250nH  Current Rating (Amps): 24A
FIXED IND 250NH 24A 3 MOHM SMD; Manufacturer Part Number: XGL4020-251MEC; Manufacturer: COILCRAFT; Tolerance: ±20%; Isat: 16.5A; Shielding: Shielded; DCR: 3mOhm; Frequency - Self Resonant: 130MHz; Inductance Frequency - Test: 1MHz; Object Type: Part; Design Item ID: L-250nH-16.5A; Series: XGL4020; Material - Core: -; Q @ Freq: -; Ratings: AEC-Q200; Operating Temperature: -40°C~125°C; Features: -; Mounting Type: SurfaceMount; Size: 4.00mmx4.00mm; Height: 2.10mm; Category: Inductor
footprint XGL4020
pins: 1, 2

## L-270nH-19.3A
designator L?  Inductance: 270nH  Current Rating (Amps): 24.2A
FIXED IND 270NH 24.2A 2.4MOHM SM; Manufacturer Part Number: XGL4030-271MEC; Manufacturer: COILCRAFT; Tolerance: ±20%; Isat: 19.3A; Shielding: Shielded; Frequency - Self Resonant: 160MHz; Inductance Frequency - Test: 1MHz; Object Type: Part; Design Item ID: L-270nH-19.3A; Series: XGL4030; Material - Core: -; DCR: 2.4mOhm; Q @ Freq: -; Ratings: AEC-Q200; Operating Temperature: -40°C~125°C; Features: -; Mounting Type: SurfaceMount; Size: 4.00mmx4.00mm; Height: 3.10mm; Category: Inductor
footprint XGL4030
pins: 1, 2

## L-300nH-17A
designator L?  Inductance: 300nH  Current Rating (Amps): 24A
FIXED IND 300NH 24A 2.9MOHM SMD; Manufacturer Part Number: XGL4030-301MEC; Manufacturer: COILCRAFT; Tolerance: ±20%; Isat: 17A; Shielding: Shielded; Frequency - Self Resonant: 130MHz; Inductance Frequency - Test: 1MHz; Object Type: Part; Design Item ID: L-300nH-17A; Series: XGL4030; Material - Core: -; DCR: 2.9mOhm; Q @ Freq: -; Ratings: AEC-Q200; Operating Temperature: -40°C~125°C; Features: -; Mounting Type: SurfaceMount; Size: 4.00mmx4.00mm; Height: 3.10mm; Category: Inductor
footprint XGL4030
pins: 1, 2

## L-330nH-3.05A
designator L?  Inductance: 330nH  Current Rating (Amps): 2.6A
FIXED IND 330NH 2.6A 35MOHM SMD; Manufacturer Part Number: XPL2010-331MLC; Manufacturer: COILCRAFT; Tolerance: ±20%; Isat: 3.05A; Shielding: Shielded; Frequency - Self Resonant: 309MHz; Inductance Frequency - Test: 1MHz; Object Type: Part; Design Item ID: L-330nH-3.05A; Series: XPL2010; Material - Core: -; DCR: 35mOhm; Q @ Freq: -; Ratings: AEC-Q200; Operating Temperature: -40°C~125°C; Features: -; Mounting Type: SurfaceMount; Size: 2.00mmx1.90mm; Height: 1.00mm; Category: Inductor
footprint XPL2010
pins: 1, 2

## L-330nH-15.2A
designator L?  Inductance: 330nH  Current Rating (Amps): 23A
FIXED IND 330NH 23A 3.6MOHM SMD; Manufacturer Part Number: XGL4020-331MEC; Manufacturer: COILCRAFT; Tolerance: ±20%; Isat: 15.2A; Shielding: Shielded; Frequency - Self Resonant: 110MHz; Inductance Frequency - Test: 1MHz; Object Type: Part; Design Item ID: L-330nH-15.2A; Series: XGL4020; Material - Core: -; DCR: 3.6mOhm; Q @ Freq: -; Ratings: AEC-Q200; Operating Temperature: -40°C~125°C; Features: -; Mounting Type: SurfaceMount; Size: 4.00mmx4.00mm; Height: 2.10mm; Category: Inductor
footprint XGL4020
pins: 1, 2

## L-330uH-200mA
designator L?  Inductance: 330uH  Current Rating (Amps): 230mA
FIXED IND 330UH 230MA 5.9OHM SMD; Manufacturer Part Number: LPS4018-334MRC; Manufacturer: COILCRAFT; Material - Core: Ferrite; Tolerance: ±20%; Isat: 200mA; Shielding: Shielded; Frequency - Self Resonant: 5.5MHz; Inductance Frequency - Test: 100kHz; Object Type: Part; Design Item ID: L-330uH-200mA; Series: LPS4018; DCR: 5.9Ohm; Q @ Freq: -; Ratings: AEC-Q200; Operating Temperature: -40°C~125°C; Features: -; Mounting Type: SurfaceMount; Size: 3.90mmx3.90mm; Height: 1.80mm; Category: Inductor
footprint LPS4018
pins: 1, 2

## L-400nH-15.5A
designator L?  Inductance: 400nH  Current Rating (Amps): 22.5A
FIXED IND 400NH 22.5A 3.2MOHM SM; Manufacturer Part Number: XGL4030-401MEC; Manufacturer: COILCRAFT; Tolerance: ±20%; Isat: 15.5A; Shielding: Shielded; Frequency - Self Resonant: 120MHz; Inductance Frequency - Test: 1MHz; Object Type: Part; Design Item ID: L-400nH-15.5A; Series: XGL4030; Material - Core: -; DCR: 3.2mOhm; Q @ Freq: -; Ratings: AEC-Q200; Operating Temperature: -40°C~125°C; Features: -; Mounting Type: SurfaceMount; Size: 4.00mmx4.00mm; Height: 3.10mm; Category: Inductor
footprint XGL4030
pins: 1, 2

## L-470nH-13.4A
designator L?  Inductance: 470nH  Current Rating (Amps): 19.7A
FIXED IND 470NH 19.7A 5.1MOHM SM; Manufacturer Part Number: XGL4020-471MEC; Manufacturer: COILCRAFT; Tolerance: ±20%; Isat: 13.4A; Shielding: Shielded; Frequency - Self Resonant: 95MHz; Inductance Frequency - Test: 1MHz; Object Type: Part; Design Item ID: L-470nH-13.4A; Series: XGL4020; Material - Core: -; DCR: 5.1mOhm; Q @ Freq: -; Ratings: AEC-Q200; Operating Temperature: -40°C~125°C; Features: -; Mounting Type: SurfaceMount; Size: 4.00mmx4.00mm; Height: 2.10mm; Category: Inductor
footprint XGL4020
pins: 1, 2

## L-470nH-14.2A
designator L?  Inductance: 470nH  Current Rating (Amps): 21.2A
FIXED IND 470NH 21.2A 3.9MOHM SM; Manufacturer Part Number: XGL4030-471MEC; Manufacturer: COILCRAFT; Tolerance: ±20%; Isat: 14.2A; Shielding: Shielded; Frequency - Self Resonant: 100MHz; Inductance Frequency - Test: 1MHz; Object Type: Part; Design Item ID: L-470nH-14.2A; Series: XGL4030; Material - Core: -; DCR: 3.9mOhm; Q @ Freq: -; Ratings: AEC-Q200; Operating Temperature: -40°C~125°C; Features: -; Mounting Type: SurfaceMount; Size: 4.00mmx4.00mm; Height: 3.10mm; Category: Inductor
footprint XGL4030
pins: 1, 2

## L-470uH-170mA
designator L?  Inductance: 470uH  Current Rating (Amps): 200mA
FIXED IND 470UH 200MA 7.8OHM SMD; Manufacturer Part Number: LPS4018-474MRC; Manufacturer: COILCRAFT; Material - Core: Ferrite; Tolerance: ±20%; Isat: 170mA; Shielding: Shielded; Frequency - Self Resonant: 4.5MHz; Inductance Frequency - Test: 100kHz; Object Type: Part; Design Item ID: L-470uH-170mA; Series: LPS4018; DCR: 7.8Ohm; Q @ Freq: -; Ratings: AEC-Q200; Operating Temperature: -40°C~125°C; Features: -; Mounting Type: SurfaceMount; Size: 3.90mmx3.90mm; Height: 1.80mm; Category: Inductor
footprint LPS4018
pins: 1, 2

## L-500nH-2.64A
designator L?  Inductance: 500nH  Current Rating (Amps): 2.3A
FIXED IND 500NH 2.3A 45MOHM SMD; Manufacturer Part Number: XPL2010-501MLC; Manufacturer: COILCRAFT; Tolerance: ±20%; Isat: 2.64A; Shielding: Shielded; Frequency - Self Resonant: 218MHz; Inductance Frequency - Test: 1MHz; Object Type: Part; Design Item ID: L-500nH-2.64A; Series: XPL2010; Material - Core: -; DCR: 45mOhm; Q @ Freq: -; Ratings: AEC-Q200; Operating Temperature: -40°C~125°C; Features: -; Mounting Type: SurfaceMount; Size: 2.00mmx1.90mm; Height: 1.00mm; Category: Inductor
footprint XPL2010
pins: 1, 2

## L-560nH-5.3A
designator L?  Inductance: 560nH  Current Rating (Amps): 2.8A
FIXED IND 560NH 2.8A 33MOHM SMD; Manufacturer Part Number: LPS4018-561MRC; Manufacturer: COILCRAFT; Material - Core: Ferrite; Tolerance: ±20%; Isat: 5.3A; Shielding: Shielded; Frequency - Self Resonant: 250MHz; Inductance Frequency - Test: 100kHz; Object Type: Part; Design Item ID: L-560nH-5.3A; Series: LPS4018; DCR: 33mOhm; Q @ Freq: -; Ratings: AEC-Q200; Operating Temperature: -40°C~125°C; Features: -; Mounting Type: SurfaceMount; Size: 3.90mmx3.90mm; Height: 1.80mm; Category: Inductor
footprint LPS4018
pins: 1, 2

## L-560uH-150mA
designator L?  Inductance: 560uH  Current Rating (Amps): 180mA
FIXED IND 560UH 180MA 10 OHM SMD; Manufacturer Part Number: LPS4018-564MRC; Manufacturer: COILCRAFT; Material - Core: Ferrite; Tolerance: ±20%; Isat: 150mA; Shielding: Shielded; DCR: 10Ohm; Frequency - Self Resonant: 4MHz; Inductance Frequency - Test: 100kHz; Object Type: Part; Design Item ID: L-560uH-150mA; Series: LPS4018; Q @ Freq: -; Ratings: AEC-Q200; Operating Temperature: -40°C~125°C; Features: -; Mounting Type: SurfaceMount; Size: 3.90mmx3.90mm; Height: 1.80mm; Category: Inductor
footprint LPS4018
pins: 1, 2

## L-600nH-11.7A
designator L?  Inductance: 600nH  Current Rating (Amps): 18.4A
FIXED IND 600NH 18.4A 5.9MOHM SM; Manufacturer Part Number: XGL4020-601MEC; Manufacturer: COILCRAFT; Tolerance: ±20%; Isat: 11.7A; Shielding: Shielded; Frequency - Self Resonant: 80MHz; Inductance Frequency - Test: 1MHz; Object Type: Part; Design Item ID: L-600nH-11.7A; Series: XGL4020; Material - Core: -; DCR: 5.9mOhm; Q @ Freq: -; Ratings: AEC-Q200; Operating Temperature: -40°C~125°C; Features: -; Mounting Type: SurfaceMount; Size: 4.00mmx4.00mm; Height: 2.10mm; Category: Inductor
footprint XGL4020
pins: 1, 2

## L-620nH-12.7A
designator L?  Inductance: 620nH  Current Rating (Amps): 15A
FIXED IND 620NH 15A 4.6MOHM SMD; Manufacturer Part Number: XGL4030-621MEC; Manufacturer: COILCRAFT; Tolerance: ±20%; Isat: 12.7A; Shielding: Shielded; Frequency - Self Resonant: 82MHz; Inductance Frequency - Test: 1MHz; Object Type: Part; Design Item ID: L-620nH-12.7A; Series: XGL4030; Material - Core: -; DCR: 4.6mOhm; Q @ Freq: -; Ratings: AEC-Q200; Operating Temperature: -40°C~125°C; Features: -; Mounting Type: SurfaceMount; Size: 4.00mmx4.00mm; Height: 3.10mm; Category: Inductor
footprint XGL4030
pins: 1, 2

## L-680nH-2.19A
designator L?  Inductance: 680nH  Current Rating (Amps): 2.1A
FIXED IND 680NH 2.1A 63MOHM SMD; Manufacturer Part Number: XPL2010-681MLC; Manufacturer: COILCRAFT; Tolerance: ±20%; Isat: 2.19A; Shielding: Shielded; Frequency - Self Resonant: 152MHz; Inductance Frequency - Test: 1MHz; Object Type: Part; Design Item ID: L-680nH-2.19A; Series: XPL2010; Material - Core: -; DCR: 63mOhm; Q @ Freq: -; Ratings: AEC-Q200; Operating Temperature: -40°C~125°C; Features: -; Mounting Type: SurfaceMount; Size: 2.00mmx1.90mm; Height: 1.00mm; Category: Inductor
footprint XPL2010
pins: 1, 2

## L-680uH-140mA
designator L?  Inductance: 680uH  Current Rating (Amps): 160mA
FIXED IND 680UH 160MA 11.5OHM SM; Manufacturer Part Number: LPS4018-684MRC; Manufacturer: COILCRAFT; Material - Core: Ferrite; Tolerance: ±20%; Isat: 140mA; Shielding: Shielded; Frequency - Self Resonant: 3.5MHz; Inductance Frequency - Test: 100kHz; Object Type: Part; Design Item ID: L-680uH-140mA; Series: LPS4018; DCR: 11.5Ohm; Q @ Freq: -; Ratings: AEC-Q200; Operating Temperature: -40°C~125°C; Features: -; Mounting Type: SurfaceMount; Size: 3.90mmx3.90mm; Height: 1.80mm; Category: Inductor
footprint LPS4018
pins: 1, 2

## L-760nH-11.8A
designator L?  Inductance: 760nH  Current Rating (Amps): 14.2A
FIXED IND 760NH 14.2A 5.5MOHM SM; Manufacturer Part Number: XGL4030-761MEC; Manufacturer: COILCRAFT; Tolerance: ±20%; Isat: 11.8A; Shielding: Shielded; Frequency - Self Resonant: 72MHz; Inductance Frequency - Test: 1MHz; Object Type: Part; Design Item ID: L-760nH-11.8A; Series: XGL4030; Material - Core: -; DCR: 5.5mOhm; Q @ Freq: -; Ratings: AEC-Q200; Operating Temperature: -40°C~125°C; Features: -; Mounting Type: SurfaceMount; Size: 4.00mmx4.00mm; Height: 3.10mm; Category: Inductor
footprint XGL4030
pins: 1, 2